# Altium footprint library Res.PcbLib: 49 footprints (part 2 of 4)
Each footprint in its own frame and in the unit in brackets; x right, y up, seen from the top. Pads: shape width x height; smd on the part's side, far side on the other; paste and mask are expansions set on the pad; w line width, h text height; cw(c..) or ccw(c..) is an arc to the next point about the centre after c.
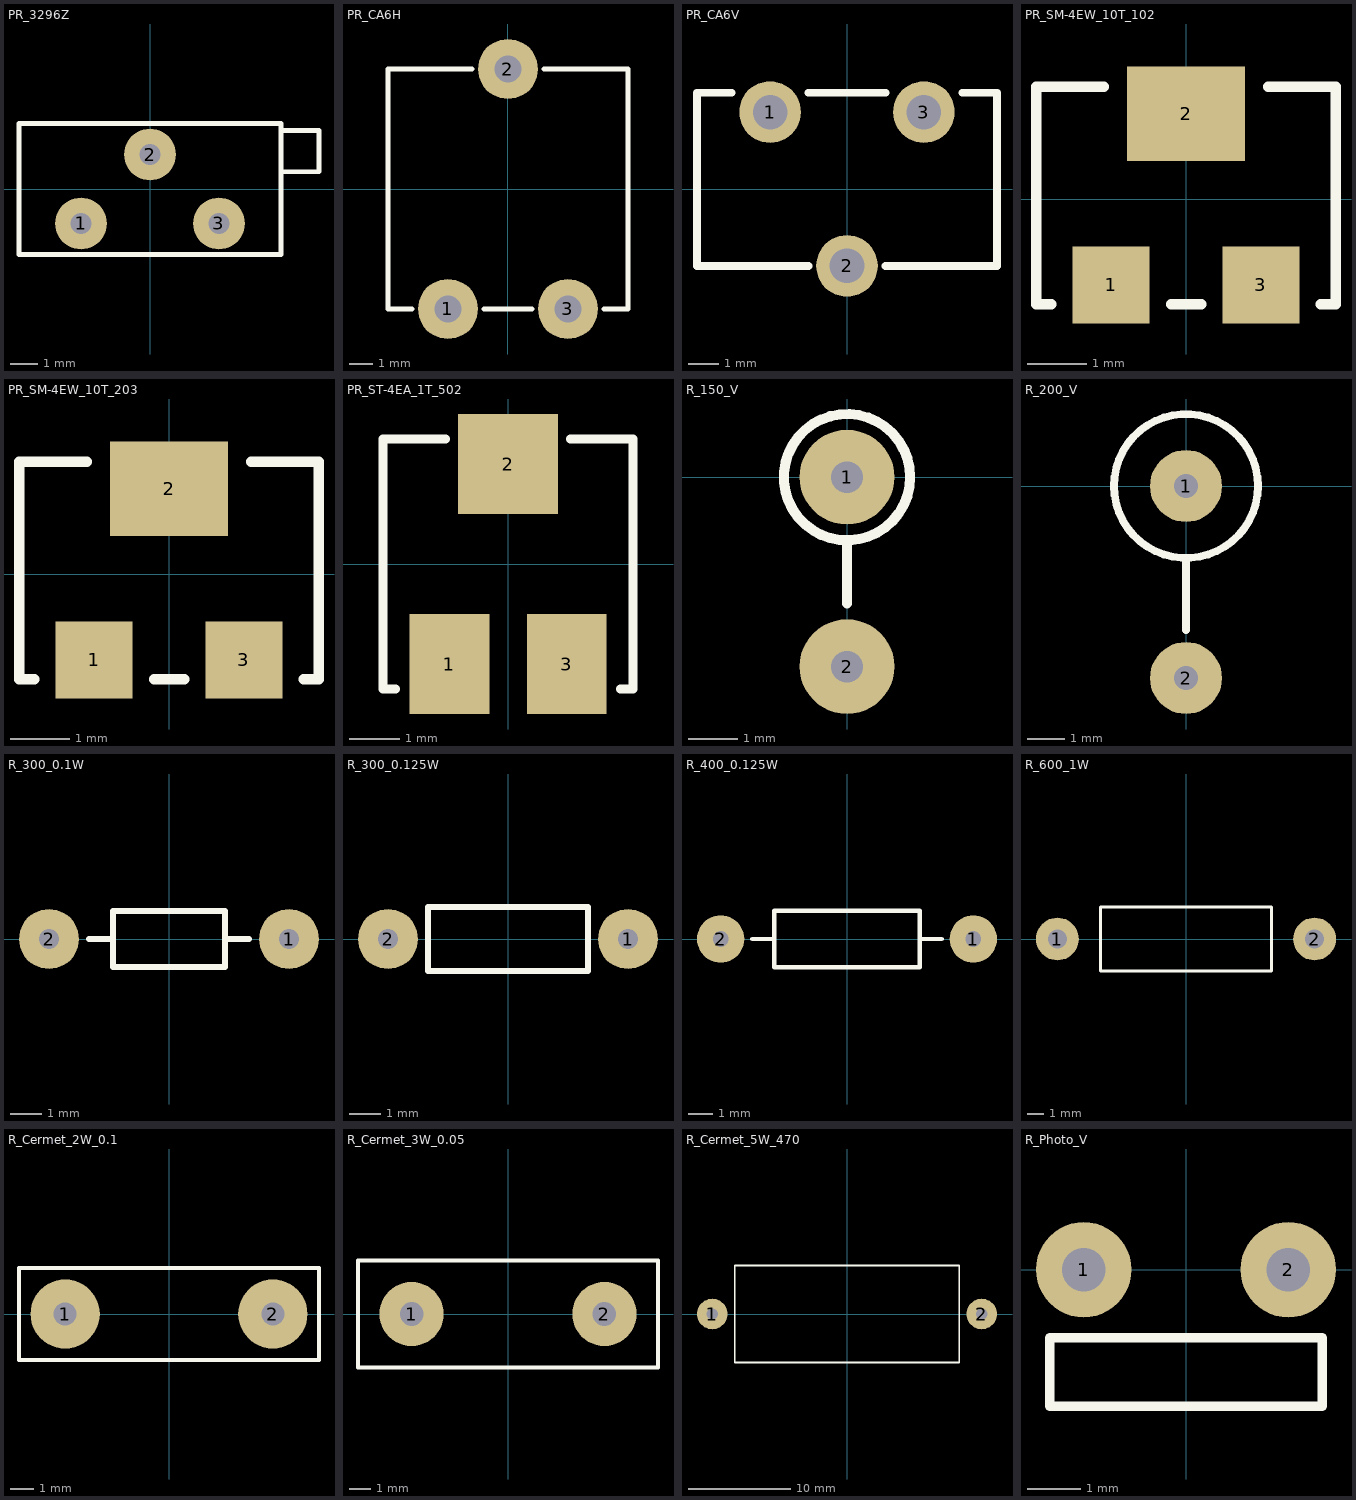
[diagram p1: the footprints below, top view; thin cyan lines are the x and y axes]

## PR_3296Z [mil] "PR 10T Bourns side trimm"
height 400
pads (3):
  round 75 hole 30: 1(-100,-50) 2(0,50) 3(100,-50)
Top Overlay:
  lines w7: 190,25 245,25 245,85 190,85 ; -190,-95 190,-95 190,95 -190,95 -190,-95
3D body "3296Z.STEP": height 395.88, standoff -61.99, extent -187.6,-94 246.65,94.98

## PR_CA6H [mil] "PR raster 200, ACP CA6H"
height 400
pads (3):
  round 100 hole 45: 1(-100,-200) 2(0,200) 3(100,-200)
Top Overlay:
  lines w8: -160,-200 -200,-200 -200,200 -60,200 ; -40,-200 40,-200 ; 60,200 200,200 200,-200 160,-200
3D body "Trimpot_ACP_CA6H.STEP": height 247.35, standoff -138.47, extent -196.7,-200.79 197,200.79

## PR_CA6V [mil] "PR raster 200, ACP CA6 Vertical"
height 600
pads (3):
  round 80 hole 45: 1(-100,100) 2(0,-100) 3(100,100)
Top Overlay:
  lines w10: -150,125 -195,125 -195,-100 -50,-100 ; -50,125 50,125 ; 50,-100 195,-100 195,125 150,125
3D body "Trimpot_ACP_CA6V.STEP": height 518.15, standoff -84.21, extent -196.85,-100 196.85,122.44

## PR_SM-4EW_10T_102 [mm] "Trimmer Top Adjustment SMD (COPAL) 10T"
height 5.334
pads (3):
  rect 1.3x1.3 smd: 1(-1.27,-1.45) 3(1.27,-1.45)
  rect 2x1.6 smd: 2(0,1.45)
Top Overlay:
  lines w0.178: -2.286,-1.778 -2.54,-1.778 -2.54,1.905 -1.397,1.905 ; -0.254,-1.778 0.254,-1.778 ; 1.397,1.905 2.54,1.905 2.54,-1.778 2.286,-1.778
3D body "SM-4EW_102.STEP": height 5.1, standoff -0.21, extent -2.559,-1.76 2.56,1.96

## PR_SM-4EW_10T_203 [mm] "Trimmer Top Adjustment SMD (COPAL) 10T"
height 5.334
pads (3):
  rect 1.3x1.3 smd: 1(-1.27,-1.45) 3(1.27,-1.45)
  rect 2x1.6 smd: 2(0,1.45)
Top Overlay:
  lines w0.178: -2.286,-1.778 -2.54,-1.778 -2.54,1.905 -1.397,1.905 ; -0.254,-1.778 0.254,-1.778 ; 1.397,1.905 2.54,1.905 2.54,-1.778 2.286,-1.778
3D body "SM-4EW_203.STEP": height 5.3, standoff -0.01, extent -2.559,-1.803 2.559,1.917

## PR_ST-4EA_1T_502 [mm] "Trimmer Top Adjustment SMD (COPAL) 1T"
height 2.3
pads (3):
  rect 1.6x2 smd: 1(-1.175,-2) 3(1.175,-2)
  rect 2x2 smd: 2(0,2)
Top Overlay:
  lines w0.178: -2.25,-2.5 -2.5,-2.5 -2.5,2.5 -1.25,2.5 ; 1.25,2.5 2.5,2.5 2.5,-2.5 2.25,-2.5
3D body "ST-4EA_502.STEP": height 2.32, standoff -0.01, extent -2.5,-2.402 2.5,2.398

## R_150_V [mil] "Rezistor, raster=150mil, vertical"
height 300
pads (2):
  round 75 hole 25 unplated: 1(0,0) 2(0,-150)
Top Overlay:
  circle w8: c0,0 r50
  lines w8: 0,-100 0,-50

## R_200_V [mil] "Rezystor, raster 200mils, Vertical"
height 400
pads (2):
  round 75 hole 25 unplated: 1(0,0) 2(0,-200)
Top Overlay:
  circle w8: c0,0 r75
  lines w8: 0,-150 0,-75

## R_300_0.1W [mil] "Res. raster 300mils (0.1W)"
height 70.87
pads (2):
  round 75 hole 25: 1(150,0) 2(-150,0)
Top Overlay:
  lines w7: -100,0 -70,0 ; 70,0 100,0 ; -70,-35 70,-35 70,35 -70,35 -70,-35
3D body "R_300_1K0_0.125W.STEP": height 70.87, standoff -43.31, extent -157.87,-35.87 157.87,35

## R_300_0.125W [mil] "Resistor raster 300mils (0.125W)"
height 100
pads (2):
  round 75 hole 25: 1(150,0) 2(-150,0)
Top Overlay:
  lines w7: -100,-40 -100,40 100,40 100,-40 -100,-40
3D body "R_300_4K7_0.25W.STEP": height 93.31, standoff -36.61, extent -157.87,-43 157.87,43.61

## R_400_0.125W [mil] "Resistor - raster 400mils (0.125W)"
height 100
pads (2):
  round 75 hole 25: 1(200,0) 2(-200,0)
Top Overlay:
  lines w7: -150,0 -115,0 ; 115,0 150,0 ; -115,-45 115,-45 115,45 -115,45 -115,-45
3D body "R_400_1K0.STEP": height 94.24, standoff -121.26, extent -212,-45.5 212,45.5

## R_600_1W [mil] "Rezystor mocy 1W"
height 180
pads (2):
  round 100 hole 45: 1(-300,0) 2(300,0)
Top Overlay:
  lines w7: -200,-75 200,-75 200,75 -200,75 -200,-75
3D body "Res_600_1W.STEP": height 157.48, standoff -98.43, extent -315.75,-78.74 315.75,78.74

## R_Cermet_2W_0.1 [mm] "Rez. cermetoey 2W, 0.1Ohm"
height 8.5
pads (2):
  round 3 hole 1: 1(-4.5,0) 2(4.5,0)
Top Overlay:
  lines w0.178: -6.5,-2 -6.5,2 6.5,2 6.5,-2 -6.5,-2
3D body "Cermet_BPR26_2W_0.1.STEP": height 8.5, standoff -2, extent -6.5,-2 6.5,2

## R_Cermet_3W_0.05 [mm] "Rez. cermetowy 3W, 0.05Ohma"
height 13
pads (2):
  round 3 hole 1.1: 1(-4.5,0) 2(4.5,0)
Top Overlay:
  lines w0.178: -7,-2.5 7,-2.5 7,2.5 -7,2.5 -7,-2.5
3D body "Cermet_BPR38_3W_0.05.STEP": height 13, standoff -2, extent -7,-2.5 7,2.5

## R_Cermet_5W_470 [mm] "Rezystor mocy 5W -470R"
height 10.16
pads (2):
  round 3 hole 1.1: 1(-13.2,0) 2(13.2,0)
Top Overlay:
  lines w0.178: -11,-4.75 11,-4.75 11,4.75 -11,4.75 -11,-4.75
3D body "CERMET_5W_470R.STEP": height 9, standoff -2, extent -13.65,-4.75 13.65,4.75

## R_Photo_V [mil] "Photoresistor Dia=5mm Vertical"
height 314.96
pads (2):
  round 70 hole 32: 1(-75,0) 2(75,0)
Top Overlay:
  lines w7: -100,-100 -100,-50 100,-50 100,-100 -100,-100
3D body "PhotoRes_5mm.STEP": height 177.17, standoff -78.74, extent -99.99,-98.42 100.01,15.75